# Altium footprint library myLibraryAltium.PcbLib: 215 footprints (part 7 of 14)
Each footprint in its own frame and in the unit in brackets; x right, y up, seen from the top. Pads: shape width x height; smd on the part's side, far side on the other; paste and mask are expansions set on the pad; w line width, h text height; cw(c..) or ccw(c..) is an arc to the next point about the centre after c.
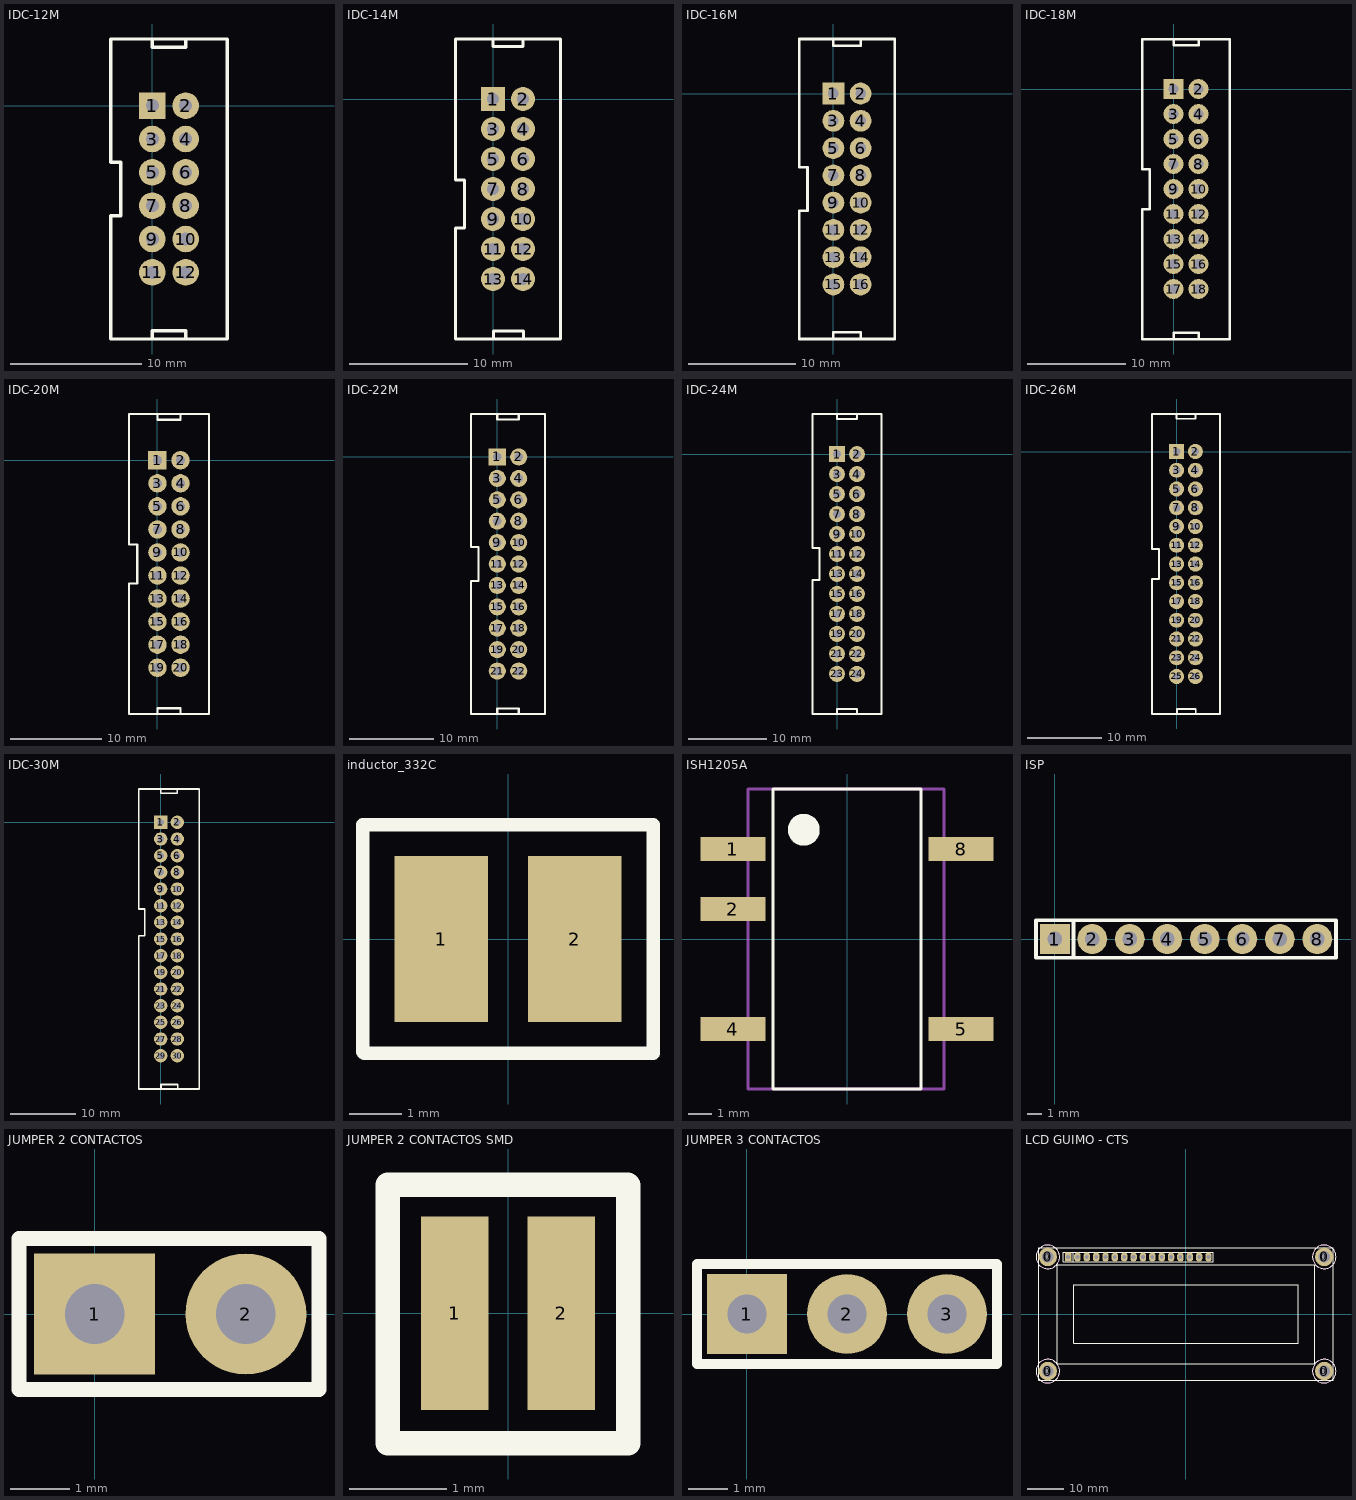
[diagram p6: the footprints below, top view; thin cyan lines are the x and y axes]

## IDC-12M [mil]
pads (12):
  rect 80x80 hole 39.37: 1(0,0)
  round 80 hole 39.37: 2(100,0) 3(0,-100) 4(100,-100) 5(0,-200) 6(100,-200) 7(0,-300) 8(100,-300) 9(0,-400) 10(100,-400) 11(0,-500) 12(100,-500)
Top Overlay:
  lines w10: 0,-700 0,-675 100,-675 100,-700 ; 0,200 0,175 100,175 100,200 ; -125,-700 225,-700 225,200 -125,200 -125,-170 -95,-170 -95,-330 -125,-330 -125,-700

## IDC-14M [mil]
pads (14):
  rect 80x80 hole 39.37: 1(0,0)
  round 80 hole 39.37: 2(100,0) 3(0,-100) 4(100,-100) 5(0,-200) 6(100,-200) 7(0,-300) 8(100,-300) 9(0,-400) 10(100,-400) 11(0,-500) 12(100,-500) 13(0,-600) 14(100,-600)
Top Overlay:
  lines w10: 0,200 0,175 100,175 100,200 ; 2,-798 2,-773 102,-773 102,-798 ; -125,-800 -125,-430 -95,-430 -95,-270 -125,-270 -125,200 225,200 225,-800 -125,-800

## IDC-16M [mil]
pads (16):
  rect 80x80 hole 39.37: 1(0,0)
  round 80 hole 39.37: 2(100,0) 3(0,-100) 4(100,-100) 5(0,-200) 6(100,-200) 7(0,-300) 8(100,-300) 9(0,-400) 10(100,-400) 11(0,-500) 12(100,-500) 13(0,-600) 14(100,-600) 15(0,-700) 16(100,-700)
Top Overlay:
  lines w10: 0,-900 0,-875 100,-875 100,-900 ; 0,200 0,175 100,175 100,200 ; -125,-900 225,-900 225,200 -125,200 -125,-270 -95,-270 -95,-430 -125,-430 -125,-900

## IDC-18M [mil]
pads (18):
  rect 80x80 hole 39.37: 1(0,0)
  round 80 hole 39.37: 2(100,0) 3(0,-100) 4(100,-100) 5(0,-200) 6(100,-200) 7(0,-300) 8(100,-300) 9(0,-400) 10(100,-400) 11(0,-500) 12(100,-500) 13(0,-600) 14(100,-600) 15(0,-700) 16(100,-700) 17(0,-800) 18(100,-800)
Top Overlay:
  lines w10: 0,-1000 0,-975 100,-975 100,-1000 ; 0,200 0,175 100,175 100,200 ; -125,-1000 -125,-480 -95,-480 -95,-320 -125,-320 -125,200 225,200 225,-1000 -125,-1000

## IDC-20M [mil]
pads (20):
  rect 80x80 hole 39.37: 1(0,0)
  round 80 hole 39.37: 2(100,0) 3(0,-100) 4(100,-100) 5(0,-200) 6(100,-200) 7(0,-300) 8(100,-300) 9(0,-400) 10(100,-400) 11(0,-500) 12(100,-500) 13(0,-600) 14(100,-600) 15(0,-700) 16(100,-700) 17(0,-800) 18(100,-800) 19(0,-900) 20(100,-900)
Top Overlay:
  lines w10: 0,-1100.59 0,-1075.59 100,-1075.59 100,-1100.59 ; 0,200.59 0,175.59 100,175.59 100,200.59 ; -123.23,-1100.59 -123.23,-534.65 -87.8,-534.65 -87.8,-365.35 -123.23,-365.35 -123.23,200.59 223.23,200.59 223.23,-1100.59 -123.23,-1100.59

## IDC-22M [mil]
pads (22):
  rect 80x80 hole 39.37: 1(0,0)
  round 80 hole 39.37: 2(100,0) 3(0,-100) 4(100,-100) 5(0,-200) 6(100,-200) 7(0,-300) 8(100,-300) 9(0,-400) 10(100,-400) 11(0,-500) 12(100,-500) 13(0,-600) 14(100,-600) 15(0,-700) 16(100,-700) 17(0,-800) 18(100,-800) 19(0,-900) 20(100,-900) 21(0,-1000) 22(100,-1000)
Top Overlay:
  lines w10: 0,-1200.59 0,-1175.59 100,-1175.59 100,-1200.59 ; 0,200.59 0,175.59 100,175.59 100,200.59 ; -123.23,-1200.59 -123.23,-580 -87.8,-580 -87.8,-420 -123.23,-420 -123.23,200.59 223.23,200.59 223.23,-1200.59 -123.23,-1200.59

## IDC-24M [mil]
pads (24):
  rect 80x80 hole 39.37: 1(0,0)
  round 80 hole 39.37: 2(100,0) 3(0,-100) 4(100,-100) 5(0,-200) 6(100,-200) 7(0,-300) 8(100,-300) 9(0,-400) 10(100,-400) 11(0,-500) 12(100,-500) 13(0,-600) 14(100,-600) 15(0,-700) 16(100,-700) 17(0,-800) 18(100,-800) 19(0,-900) 20(100,-900) 21(0,-1000) 22(100,-1000) 23(0,-1100) 24(100,-1100)
Top Overlay:
  lines w10: 0,-1300.59 0,-1275.59 100,-1275.59 100,-1300.59 ; 0,200.59 0,175.59 100,175.59 100,200.59 ; -123.23,-1300.59 -123.23,-630 -87.8,-630 -87.8,-470 -123.23,-470 -123.23,200.59 223.23,200.59 223.23,-1300.59 -123.23,-1300.59

## IDC-26M [mil]
pads (26):
  rect 80x80 hole 39.37: 1(0,0)
  round 80 hole 39.37: 2(100,0) 3(0,-100) 4(100,-100) 5(0,-200) 6(100,-200) 7(0,-300) 8(100,-300) 9(0,-400) 10(100,-400) 11(0,-500) 12(100,-500) 13(0,-600) 14(100,-600) 15(0,-700) 16(100,-700) 17(0,-800) 18(100,-800) 19(0,-900) 20(100,-900) 21(0,-1000) 22(100,-1000) 23(0,-1100) 24(100,-1100) 25(0,-1200) 26(100,-1200)
Top Overlay:
  lines w10: 0,200 0,175 100,175 100,200 ; 2,-1398 2,-1373 102,-1373 102,-1398 ; -131.1,-1400 -131.1,-680 -95,-680 -95,-520 -131.1,-520 -131.1,200 231.1,200 231.1,-1400 -131.1,-1400

## IDC-30M [mil]
pads (30):
  rect 80x80 hole 39.37: 1(0,0)
  round 80 hole 39.37: 2(100,0) 3(0,-100) 4(100,-100) 5(0,-200) 6(100,-200) 7(0,-300) 8(100,-300) 9(0,-400) 10(100,-400) 11(0,-500) 12(100,-500) 13(0,-600) 14(100,-600) 15(0,-700) 16(100,-700) 17(0,-800) 18(100,-800) 19(0,-900) 20(100,-900) 21(0,-1000) 22(100,-1000) 23(0,-1100) 24(100,-1100) 25(0,-1200) 26(100,-1200) 27(0,-1300) 28(100,-1300) 29(0,-1400) 30(100,-1400)
Top Overlay:
  lines w10: 0,200 0,175 100,175 100,200 ; 2,-1598 2,-1573 102,-1573 102,-1598 ; -131.1,-1600 -131.1,-680 -95,-680 -95,-520 -131.1,-520 -131.1,200 231.1,200 231.1,-1600 -131.1,-1600

## inductor_332C [mm]
pads (2):
  rect 1.8x3.2 smd: 1(-1.29,0) 2(1.29,0)
Top Overlay:
  lines w0.254: -2.8,2.175 -2.8,-2.175 -2.775,-2.2 2.8,-2.2 ; -2.8,2.2 2.8,2.2 ; 2.8,-2.175 2.8,2.175
3D body "User Library-Murata_8200Series.step": height 2.11, standoff 0, extent -1.6,-1.25 1.6,1.25

## ISH1205A [mm] "Isolated Module DC DC Converter 1 Output 5V 400mA 10.8V - 13.2V Input"
height 4.85
pads (5):
  rect 2.75x1 smd: 1(-4.83,3.81) 2(-4.83,1.27) 4(-4.83,-3.81) 5(4.83,-3.81) 8(4.83,3.81)
Top Overlay:
  circle w0.75: c-1.829,4.623 r0.3
  lines w0.127: -3.124,-6.35 -3.124,6.35 3.124,6.35 3.124,-6.35 -3.124,-6.35
Mechanical 1:
  lines w0.127: -4.195,-6.35 4.111,-6.35 4.111,6.35 -4.195,6.35 -4.195,-6.35
3D body: height 7.25, standoff 0, extent -4.195,-6.35 4.111,6.35

## ISP [mil]
pads (8):
  rect 80x80 hole 39.37: 1(0,0)
  round 80 hole 39.37: 2(100,0) 3(200,0) 4(300,0) 5(400,0) 6(500,0) 7(600,0) 8(700,0)
Top Overlay:
  lines w10: 50,-50 50,50 ; -50,-50 750,-50 750,50 -50,50 -50,-50

## JUMPER 2 CONTACTOS [mil]
pads (2):
  rect 80x80 hole 39.37: 1(0,0)
  round 80 hole 39.37: 2(100,0)
Top Overlay:
  lines w10: -50,-50 148.42,-50 148.42,50 -50,50 -50,-50

## JUMPER 2 CONTACTOS SMD [mm]
pads (2):
  rect 0.7x2 smd: 1(-0.55,0) 2(0.55,0)
Top Overlay:
  lines w0.254: -1.245,-1.345 1.245,-1.345 1.245,1.321 1.238,1.328 -1.245,1.328 -1.245,-1.345

## JUMPER 3 CONTACTOS [mil]
pads (3):
  rect 80x80 hole 39.37: 1(0,0)
  round 80 hole 39.37: 2(100,0) 3(200,0)
Top Overlay:
  lines w10: -50,-50 250,-50 250,50 -50,50 -50,-50

## LCD GUIMO - CTS [mm] "LCD"
pads (24):
  round 3 on Top Overlay: 0(-37.5,-15.5) 0(-37.5,15.5) 0(37.5,-15.5) 0(37.5,15.5)
  round 5 hole 3.17: 0(-37.5,-15.5) 0(-37.5,15.5) 0(37.5,-15.5) 0(37.5,15.5)
  rect 1.75x2.5 hole 1: 1(-32,15.46)
  oval 1.75x2.5 hole 1: 2(-29.46,15.46) 3(-26.92,15.46) 4(-24.38,15.46) 5(-21.84,15.46) 6(-19.3,15.46) 7(-16.76,15.46) 8(-14.22,15.46) 9(-11.68,15.46) 10(-9.14,15.46) 11(-6.6,15.46) 12(-4.06,15.46) 13(-1.52,15.46) 14(1.02,15.46) 15(3.56,15.46) 16(6.1,15.46)
Top Overlay:
  circle w0.254: c37.5,-15.5 r3.2
  circle w0.254: c-37.5,-15.5 r3.2
  circle w0.254: c-37.5,15.5 r3.2
  circle w0.254: c37.5,15.5 r3.2
  lines w0.254: -30.77,14.19 -30.77,16.73 ; -40,-18 40,-18 40,18 -40,18 -40,-18 ; -35,-13.5 35,-13.5 35,13.4 -35,13.4 -35,-13.5 ; -33.27,14.19 7.37,14.19 7.37,16.73 -33.27,16.73 -33.27,14.19 ; -30.5,-7.9 30.5,-7.9 30.5,7.9 -30.5,7.9 -30.5,-7.9
Keep-Out Layer:
  circle w0.254: c37.5,-15.5 r3.2
  circle w0.254: c-37.5,-15.5 r3.2
  circle w0.254: c-37.5,15.5 r3.2
  circle w0.254: c37.5,15.5 r3.2